# Altium footprint library master.PcbLib: 98 footprints (part 1 of 7)
Each footprint in its own frame and in the unit in brackets; x right, y up, seen from the top. Pads: shape width x height; smd on the part's side, far side on the other; paste and mask are expansions set on the pad; w line width, h text height; cw(c..) or ccw(c..) is an arc to the next point about the centre after c.
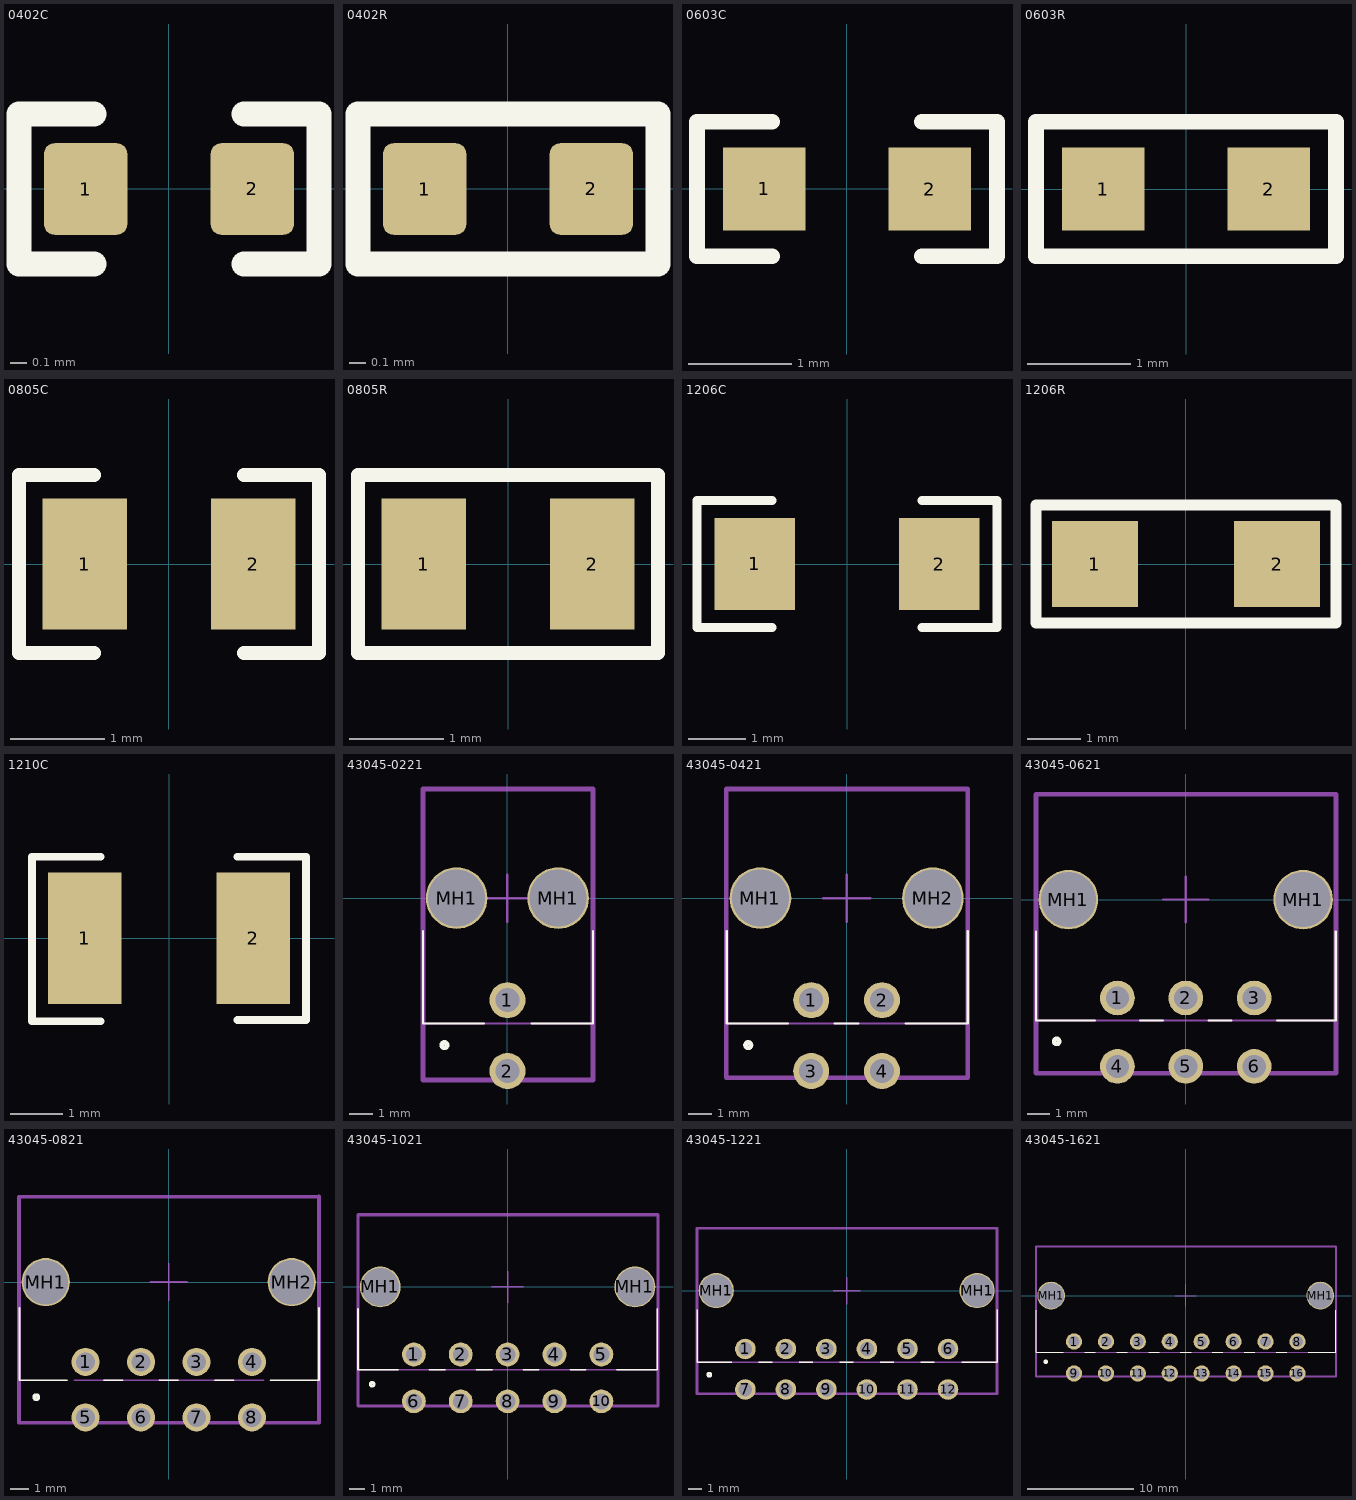
[diagram p0: the footprints below, top view; thin cyan lines are the x and y axes]

## 0402C [mm] "Chip Capacitor, 2-Leads, Body 1.0x0.5mm, IPC Medium Density"
height 0.6
pads (2):
  rrect25% 0.5x0.55 smd paste-2: 1(-0.5,0) 2(0.5,0)
Top Overlay:
  lines w0.15: -0.45,-0.45 -0.9,-0.45 -0.9,0.45 -0.45,0.45 ; 0.45,-0.45 0.9,-0.45 0.9,0.45 0.45,0.45
Top Paste:
  region: 0.25,0 0.4,0.25 0.675,0.25 0.725,0.2 0.725,-0.2 0.675,-0.25 0.4,-0.25
  region: -0.25,0 -0.4,-0.25 -0.675,-0.25 -0.725,-0.2 -0.725,0.2 -0.675,0.25 -0.4,0.25
  lines w0.1: -0.675,-0.2 -0.675,0.2 ; 0.675,-0.2 0.675,0.2
3D body: height 0.5, standoff 0, extent -0.5,-0.25 -0.25,0.25
3D body: height 0.5, standoff 0, extent 0.25,-0.25 0.5,0.25
3D body: height 0.5, standoff 0, extent -0.25,-0.25 0.25,0.25

## 0402R [mm] "Chip Capacitor, 2-Leads, Body 1.0x0.5mm, IPC Medium Density"
height 0.6
pads (2):
  rrect25% 0.5x0.55 smd paste-2: 1(-0.5,0) 2(0.5,0)
Top Overlay:
  lines w0.15: -0.9,-0.45 0.9,-0.45 0.9,0.45 -0.9,0.45 -0.9,-0.45
Top Paste:
  region: 0.25,0 0.4,0.25 0.675,0.25 0.725,0.2 0.725,-0.2 0.675,-0.25 0.4,-0.25
  region: -0.25,0 -0.4,-0.25 -0.675,-0.25 -0.725,-0.2 -0.725,0.2 -0.675,0.25 -0.4,0.25
  lines w0.1: -0.675,-0.2 -0.675,0.2 ; 0.675,-0.2 0.675,0.2
3D body: height 0.23, standoff 0.03, extent -0.25,-0.25 0.25,0.25
3D body: height 0.25, standoff 0, extent 0.25,-0.25 0.5,0.25
3D body: height 0.25, standoff 0, extent -0.5,-0.25 -0.25,0.25
3D body: height 0.25, standoff 0.23, extent -0.225,-0.225 0.225,0.225

## 0603C [mm]
height 2.438
pads (2):
  rect 0.8x0.8 smd paste-10: 1(-0.8,0) 2(0.8,0)
Top Overlay:
  lines w0.15: -0.725,-0.65 -1.45,-0.65 -1.45,0.65 -0.725,0.65 ; 0.725,-0.65 1.45,-0.65 1.45,0.65 0.725,0.65
Top Paste:
  region: 1.175,-0.375 1.175,0.375 0.634,0.375 0.4,0 0.634,-0.375
  region: -1.175,0.375 -1.175,-0.375 -0.634,-0.375 -0.4,0 -0.634,0.375
3D body "0603C.STEP": height 1.02, standoff 0, extent -0.8,-0.405 0.8,0.405

## 0603R [mm]
pads (2):
  rect 0.8x0.8 smd paste-10: 1(-0.8,0) 2(0.8,0)
Top Overlay:
  lines w0.15: -1.45,-0.65 -1.45,0.65 1.45,0.65 1.45,-0.65 -1.45,-0.65
Top Paste:
  region: 1.175,-0.375 1.175,0.375 0.634,0.375 0.4,0 0.634,-0.375
  region: -1.175,0.375 -1.175,-0.375 -0.634,-0.375 -0.4,0 -0.634,0.375
3D body "0603R.STEP": height 0.45, standoff 0, extent -0.8,-0.4 0.8,0.4

## 0805C [mm]
pads (2):
  rect 0.9x1.4 smd paste-10: 1(-0.9,0) 2(0.9,0)
Top Overlay:
  lines w0.15: -0.8,-0.95 -1.6,-0.95 -1.6,0.95 -0.8,0.95 ; 0.8,-0.95 1.6,-0.95 1.6,0.95 0.8,0.95
Top Paste:
  region: 1.325,-0.675 1.325,0.675 0.729,0.675 0.45,0 0.729,-0.675
  region: -1.325,0.675 -1.325,-0.675 -0.729,-0.675 -0.45,0 -0.729,0.675
3D body: height 1.25, standoff 0, extent -1,-0.625 -0.5,0.625
3D body: height 1.25, standoff 0, extent 0.5,-0.625 1,0.625
3D body: height 1.22, standoff 0.03, extent -0.5,-0.6 0.5,0.6

## 0805R [mm]
pads (2):
  rect 0.9x1.4 smd paste-10: 1(-0.9,0) 2(0.9,0)
Top Overlay:
  lines w0.15: -1.6,-0.95 1.6,-0.95 1.6,0.95 -1.6,0.95 -1.6,-0.95
Top Paste:
  region: 1.325,-0.675 1.325,0.675 0.729,0.675 0.45,0 0.729,-0.675
  region: -1.325,0.675 -1.325,-0.675 -0.729,-0.675 -0.45,0 -0.729,0.675
3D body: height 0.6, standoff 0.58, extent -0.55,-0.6 0.55,0.6
3D body: height 0.58, standoff 0.03, extent -0.975,-0.65 0.975,0.65
3D body: height 0.6, standoff 0.58, extent -0.975,-0.65 -0.6,0.65
3D body: height 0.03, standoff 0, extent -0.975,-0.65 -0.6,0.65
3D body: height 0.6, standoff 0, extent -1,-0.65 -0.975,0.65
3D body: height 0.6, standoff 0, extent 0.975,-0.65 1,0.65
3D body: height 0.03, standoff 0, extent 0.6,-0.65 0.975,0.65
3D body: height 0.6, standoff 0.58, extent 0.6,-0.65 0.975,0.65

## 1206C [mm]
height 2.438
pads (2):
  rect 1.4x1.6 smd paste-10: 1(-1.6,0) 2(1.6,0)
Top Overlay:
  lines w0.15: -1.3,-1.1 -2.6,-1.1 -2.6,1.1 -1.3,1.1 ; 1.3,-1.1 2.6,-1.1 2.6,1.1 1.3,1.1
Top Paste:
  region: 2.275,0.775 2.275,-0.775 1.4,-0.775 0.9,0 1.4,0.775
  region: -2.275,-0.775 -2.275,0.775 -1.4,0.775 -0.9,0 -1.4,-0.775
3D body: height 1.78, standoff 0, extent 1.1,-0.8 1.6,0.8
3D body: height 1.76, standoff 0.03, extent -1.1,-0.775 1.1,0.775
3D body: height 1.78, standoff 0, extent -1.6,-0.8 -1.1,0.8

## 1206R [mm]
height 0.6
pads (2):
  rect 1.6x1.6 smd: 1(-1.7,0) 2(1.7,0)
Top Overlay:
  lines w0.2: -2.8,-1.1 -2.8,1.1 2.8,1.1 2.8,-1.1 -2.8,-1.1
3D body: height 0.55, standoff 0.5, extent 1.1,-0.8 1.5,0.8
3D body: height 0.55, standoff 0, extent 1.5,-0.8 1.55,0.8
3D body: height 0.05, standoff 0, extent 1.1,-0.8 1.5,0.8
3D body: height 0.05, standoff 0, extent -1.5,-0.8 -1.1,0.8
3D body: height 0.55, standoff 0, extent -1.55,-0.8 -1.5,0.8
3D body: height 0.55, standoff 0.5, extent -1.5,-0.8 -1.1,0.8
3D body: height 0.5, standoff 0.05, extent -1.5,-0.8 1.5,0.8
3D body: height 0.55, standoff 0.5, extent -1,-0.7 1,0.7

## 1210C [mm]
height 2.438
pads (2):
  rect 1.4x2.5 smd paste-10: 1(-1.6,0) 2(1.6,0)
Top Overlay:
  lines w0.15: -1.3,-1.575 -2.6,-1.575 -2.6,1.55 -1.3,1.55 ; 1.3,-1.55 2.6,-1.55 2.6,1.55 1.3,1.55
Top Paste:
  region: -2.275,-1.225 -2.275,1.225 -1.35,1.225 -0.925,0 -1.35,-1.225
  region: 2.275,1.225 2.275,-1.225 1.35,-1.225 0.925,0 1.35,1.225
3D body: height 1.78, standoff 0, extent 1.1,-1.2 1.6,1.2
3D body: height 1.76, standoff 0.03, extent -1.1,-1.15 1.1,1.15
3D body: height 1.78, standoff 0, extent -1.6,-1.2 -1.1,1.2

## 43045-0221 [mm] "Micro-Fit 3.0 Right Angle Header, 3.00mm Pitch, Dual Row, 2 Circuits, with Snap-in Plastic Peg PCB Lock, Tin, Glow Wire Capable, Black, 43045-0221"
height 8.763
pads (4):
  round 1.524 hole 1.016: 1(0,-4.32) 2(0,-7.32)
  round 2.61 hole 2.41 paste-5 mask+0.15: MH1(-2.15,0) MH1(2.15,0)
Top Overlay:
  circle w0.2: c-2.667,-6.225 r0.113
  lines w0.1: -3.575,-1.4 -3.575,-5.31 -1,-5.31 ; 1.025,-5.31 3.625,-5.31 3.625,-1.4
Mechanical 13:
  lines w0.1: -3.575,-5.31 3.625,-5.31 3.625,4.62 -3.575,4.62 -3.575,-5.31
Mechanical 15:
  lines w0.1: -1,0 1,0 ; 0,-1 0,1
  lines w0.2: -3.575,-7.7 -3.575,4.62 3.625,4.62 3.625,-7.7 -3.575,-7.7
3D body "430450221.stp": height 8.77, standoff -3.18, extent -3.575,-7.62 3.625,4.62

## 43045-0421 [mm] "Micro-Fit 3.0 Right Angle Header, 3.00mm Pitch, Dual Row, 4 Circuits, with Snap-in Plastic Peg PCB Lock, Tin, Glow Wire Capable, Black, 43045-0421"
height 8.763
pads (6):
  round 1.524 hole 1.016: 1(-1.5,-4.32) 2(1.5,-4.32) 3(-1.5,-7.32) 4(1.5,-7.32)
  round 2.61 hole 2.41 paste-5 mask+0.15: MH1(-3.65,0) MH2(3.65,0)
Top Overlay:
  circle w0.2: c-4.167,-6.225 r0.113
  lines w0.1: -5.075,-1.4 -5.075,-5.31 -2.5,-5.31 ; -0.5,-5.31 0.5,-5.31 ; 2.5,-5.31 5.125,-5.31 5.125,-1.4
Mechanical 13:
  lines w0.1: -5.095,-5.31 5.125,-5.31 5.125,4.62 -5.095,4.62 -5.095,-5.31
Mechanical 15:
  lines w0.1: -1,0 1,0 ; 0,-1 0,1
  lines w0.2: -5.095,-7.6 -5.095,4.62 5.125,4.62 5.125,-7.6 -5.095,-7.6
3D body "43045-0421.stp": height 8.83, standoff -3.12, extent -5.075,-7.62 5.125,4.62

## 43045-0621 [mm] "Micro-Fit 3.0 Right Angle Header, 3.00mm Pitch, Dual Row, 6 Circuits, with Snap-in Plastic Peg PCB Lock, Tin, Glow Wire Capable, Black, 43045-0621"
height 8.763
pads (8):
  round 1.524 hole 1.016: 1(-3,-4.32) 2(0,-4.32) 3(3,-4.32) 4(-3,-7.32) 5(0,-7.32) 6(3,-7.32)
  round 2.61 hole 2.41 paste-5 mask+0.15: MH1(-5.15,0) MH1(5.15,0)
Top Overlay:
  circle w0.2: c-5.667,-6.225 r0.113
  lines w0.1: -6.575,-1.4 -6.575,-5.31 -4,-5.31 ; -2,-5.31 -1,-5.31 ; 1,-5.31 2,-5.31 ; 4,-5.31 6.575,-5.31 6.575,-1.4
Mechanical 13:
  lines w0.1: -6.575,-5.31 6.591,-5.31 6.591,4.62 -6.575,4.62 -6.575,-5.31
Mechanical 15:
  lines w0.1: -1,0 1,0 ; 0,-1 0,1
  lines w0.2: -6.575,-7.62 -6.575,4.62 6.591,4.62 6.591,-7.62 -6.575,-7.62
3D body "43045-0621.stp": height 8.83, standoff -3.11, extent -6.559,-7.62 6.591,4.62

## 43045-0821 [mm] "Micro-Fit 3.0 Right Angle Header, 3.00mm Pitch, Dual Row, 4 Circuits, with Snap-in Plastic Peg PCB Lock, Tin, Glow Wire Capable, Black, 43045-0821"
height 8.763
pads (10):
  round 1.524 hole 1.016: 1(-4.5,-4.32) 2(-1.5,-4.32) 3(1.5,-4.32) 4(4.5,-4.32) 5(-4.5,-7.32) 6(-1.5,-7.32) 7(1.5,-7.32) 8(4.5,-7.32)
  round 2.61 hole 2.41 paste-5 mask+0.15: MH1(-6.65,0) MH2(6.65,0)
Top Overlay:
  circle w0.2: c-7.167,-6.225 r0.113
  lines w0.1: -8.075,-1.4 -8.075,-5.31 -5.5,-5.31 ; -3.5,-5.31 -2.5,-5.31 ; -0.5,-5.31 0.5,-5.31 ; 2.5,-5.31 3.5,-5.31 ; 5.5,-5.31 8.125,-5.31 8.125,-1.4
Mechanical 13:
  lines w0.1: -8.095,-5.31 -8.095,4.625 8.125,4.631 8.125,-5.31 ; -5.095,-5.31 5.125,-5.31
Mechanical 15:
  lines w0.1: -1,0 1,0 ; 0,-1 0,1
  lines w0.2: -8.1,4.619 8.125,4.625 ; -8.095,4.62 -8.095,-7.6 8.125,-7.6 8.125,-6.375 ; 8.125,-6.4 8.125,4.62
3D body "430450821.stp": height 8.83, standoff -3.12, extent -8.075,-7.62 8.125,4.62

## 43045-1021 [mil] "Micro-Fit 3.0 Right Angle Header, 3.00mm Pitch, Dual Row, 10 Circuits, with Snap-in Plastic Peg PCB Lock, Tin, Glow Wire Capable, Black, 43045-1021"
height 345
pads (12):
  round 60 hole 40: 1(-236.22,-170.08) 2(-118.11,-170.08) 3(0,-170.08) 4(118.11,-170.08) 5(236.22,-170.08) 6(-236.22,-288.19) 7(-118.11,-288.19) 8(0,-288.19) 9(118.11,-288.19) 10(236.22,-288.19)
  round 102.76 hole 94.88 paste-196.85 mask+5.91: MH1(-320.87,0) MH1(320.87,0)
Top Overlay:
  circle w7.87: c-341.22,-245.08 r4.44
  lines w3.94: -376.97,-55.12 -376.97,-209.06 -275.59,-209.06 ; -196.85,-209.06 -157.48,-209.06 ; -78.74,-209.06 -39.37,-209.06 ; 39.37,-209.06 78.74,-209.06 ; 157.48,-209.06 196.85,-209.06 ; 275.59,-209.06 376.97,-209.06 376.97,-55.12
Mechanical 13:
  lines w3.94: -376.97,-209.06 -376.97,181.89 378.93,181.89 378.93,-209.06 -376.97,-209.06
Mechanical 15:
  lines w3.94: -39.37,0 39.37,0 ; 0,-39.37 0,39.37
  lines w7.87: -376.97,-300 378.93,-300 378.93,181.89 -376.97,181.89 -376.97,-300
3D body "430451021.stp": height 347.64, standoff -122.83, extent -376.97,-300 378.93,181.89

## 43045-1221 [mil] "Micro-Fit 3.0 Right Angle Header, 3.00mm Pitch, Dual Row, 12 Circuits, with Snap-in Plastic Peg PCB Lock, Tin, Glow Wire Capable, Black, 43045-1221"
height 345
pads (14):
  round 60 hole 40: 1(-295.28,-170) 2(-177.17,-170) 3(-59.06,-170) 4(59.06,-170) 5(177.17,-170) 6(295.28,-170) 7(-295.28,-287.99) 8(-177.17,-287.99) 9(-59.06,-287.99) 10(59.06,-287.99) 11(177.17,-287.99) 12(295.28,-287.99)
  round 102.76 hole 94.88 paste-196.85 mask+5.91: MH1(-379.92,0.08) MH1(379.92,0.08)
Top Overlay:
  circle w7.87: c-400.28,-245 r4.44
  lines w3.94: -436.02,-55.04 -436.02,-208.98 -334.65,-208.98 ; -255.91,-208.98 -216.54,-208.98 ; -137.8,-208.98 -98.43,-208.98 ; -19.68,-208.98 19.69,-208.98 ; 98.43,-208.98 137.8,-208.98 ; 216.54,-208.98 255.91,-208.98 ; 334.65,-208.98 437.99,-208.98 437.99,-55.04
Mechanical 13:
  lines w3.94: -436.02,-208.98 -436.02,181.82 437.99,181.89 437.99,-208.98 -436.02,-208.98
Mechanical 15:
  lines w3.94: -39.37,0 39.37,0 ; 0,-39.37 0,39.37
  lines w7.87: -436.02,-300 437.99,-300 437.99,181.89 -436.02,181.82 -436.02,-300
3D body "430451221.stp": height 345.16, standoff -125.31, extent -436.02,-300 437.99,181.89

## 43045-1621 [mil] "Micro-Fit 3.0 Right Angle Header, 3.00mm Pitch, Dual Row, 16 Circuits, with Snap-in Plastic Peg PCB Lock, Tin, Glow Wire Capable, Black, 43045-1621"
height 345
pads (18):
  round 60 hole 40: 1(-413.39,-170) 2(-295.28,-170) 3(-177.17,-170) 4(-59.06,-170) 5(59.06,-170) 6(177.17,-170) 7(295.28,-170) 8(413.39,-170) 9(-413.39,-287.99) 10(-295.28,-287.99) 11(-177.17,-287.99) 12(-59.06,-287.99) 13(59.06,-287.99) 14(177.17,-287.99) 15(295.28,-287.99) 16(413.39,-287.99)
  round 102.76 hole 94.88 paste-196.85 mask+5.91: MH1(-498.03,0.08) MH1(498.03,0.08)
Top Overlay:
  circle w7.87: c-518.39,-245 r4.44
  lines w3.94: -554.13,-55.04 -554.13,-208.98 -452.76,-208.98 ; -374.02,-208.98 -334.65,-208.98 ; -255.91,-208.98 -216.54,-208.98 ; -137.8,-208.98 -98.43,-208.98 ; -19.68,-208.98 19.69,-208.98 ; 98.43,-208.98 137.8,-208.98 ; 216.54,-208.98 255.91,-208.98 ; 334.65,-208.98 374.02,-208.98 ; 452.76,-208.98 556.1,-208.98 556.1,-55.04
Mechanical 13:
  lines w3.94: -554.13,-208.98 -554.13,181.89 556.1,181.89 556.1,-208.98 -554.13,-208.98
Mechanical 15:
  lines w3.94: -39.37,0 39.37,0 ; 0,-39.37 0,39.37
  lines w7.87: -554.13,-300 556.1,-300 556.1,181.89 -554.13,181.89 -554.13,-300
3D body "430451621.stp": height 345.16, standoff -125.31, extent -554.13,-300 556.1,181.89